# Altium footprint library con-amp.PCBLIB: 295 footprints (part 1 of 19)
Each footprint in its own frame and in the unit in brackets; x right, y up, seen from the top. Pads: shape width x height; smd on the part's side, far side on the other; paste and mask are expansions set on the pad; w line width, h text height; cw(c..) or ccw(c..) is an arc to the next point about the centre after c.
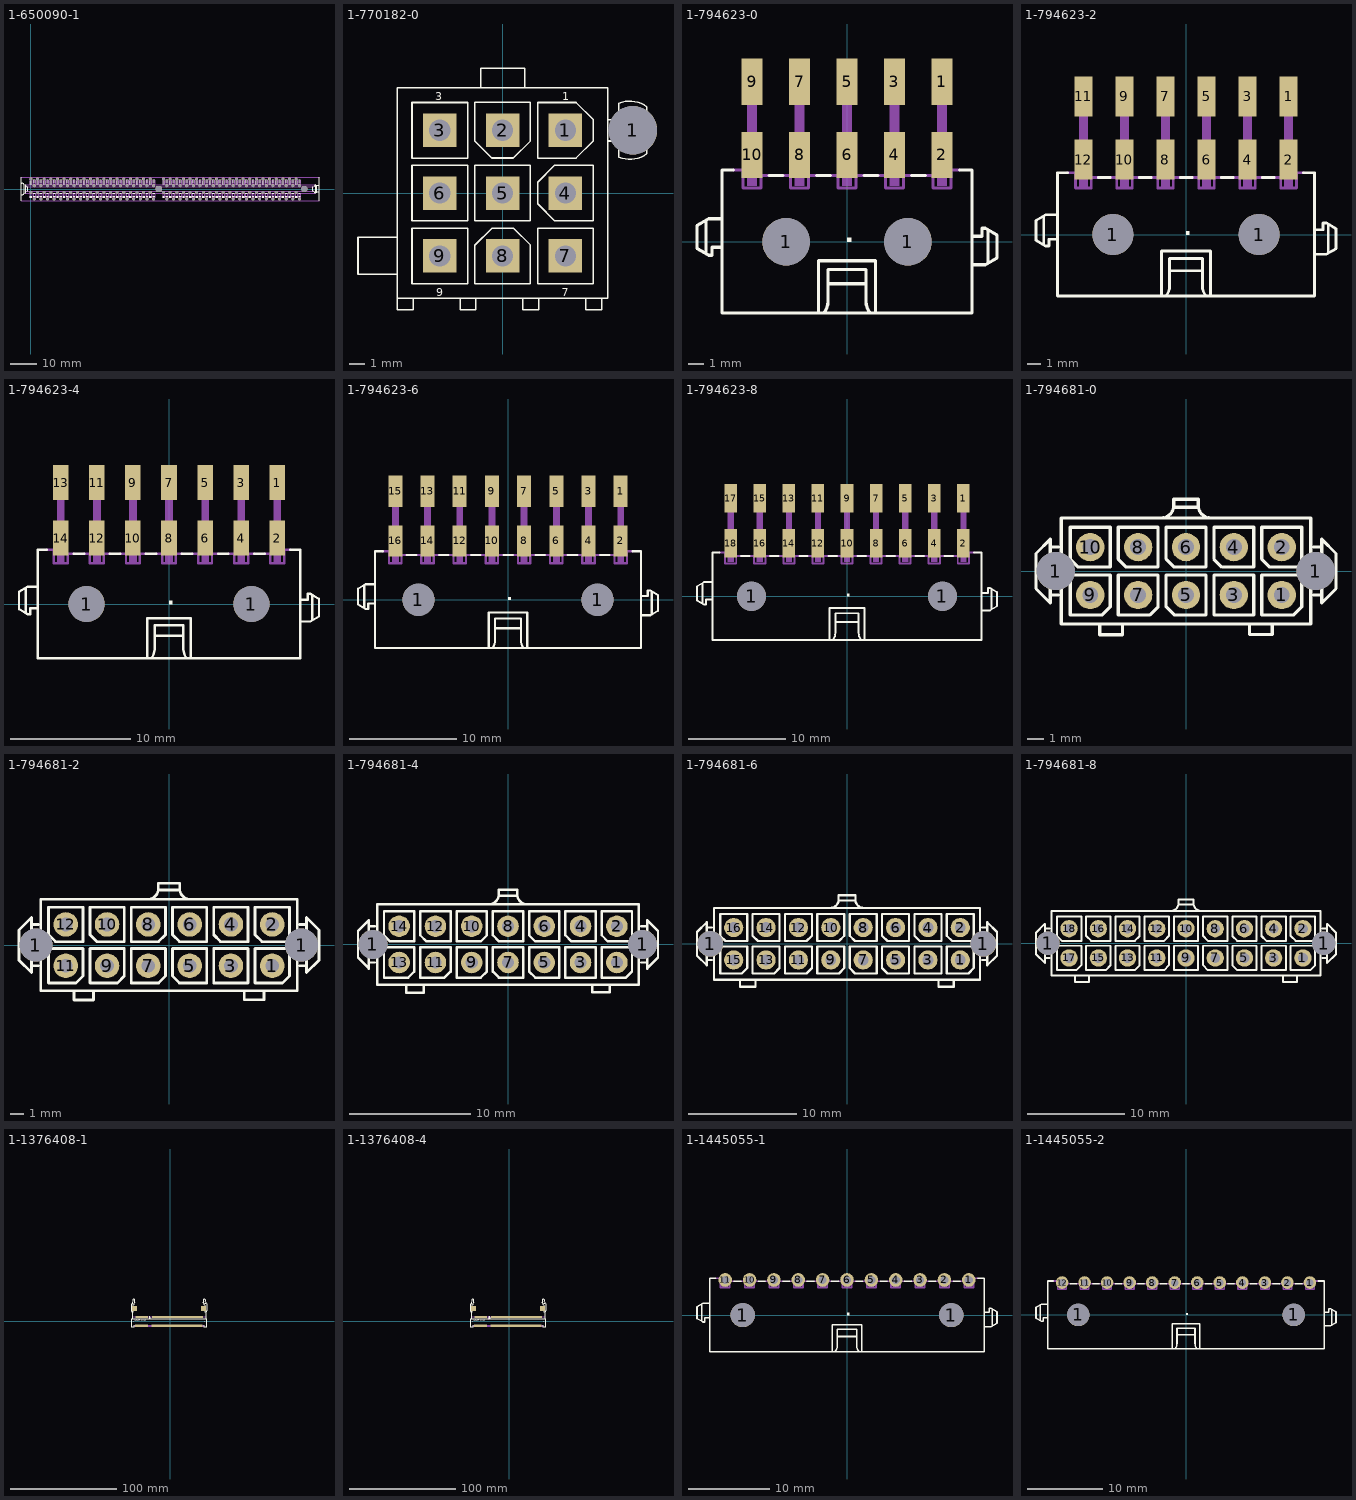
[diagram p0: the footprints below, top view; thin cyan lines are the x and y axes]

## 1-650090-1 [mm]
pads (162):
  round 1.2 hole 1: 1(0,-1.27) 2(0,3.81) 3(1.27,-3.81) 4(1.27,1.27) 5(2.54,-1.27) 6(2.54,3.81) 7(3.81,-3.81) 8(3.81,1.27) 9(5.08,-1.27) 10(5.08,3.81) 11(6.35,-3.81) 12(6.35,1.27) 13(7.62,-1.27) 14(7.62,3.81) 15(8.89,-3.81) 16(8.89,1.27) 17(10.16,-1.27) 18(10.16,3.81) 19(11.43,-3.81) 20(11.43,1.27) 21(12.7,-1.27) 22(12.7,3.81) 23(13.97,-3.81) 24(13.97,1.27) 25(15.24,-1.27) 26(15.24,3.81) 27(16.51,-3.81) 28(16.51,1.27) 29(17.78,-1.27) 30(17.78,3.81) 31(19.05,-3.81) 32(19.05,1.27) 33(20.32,-1.27) 34(20.32,3.81) 35(21.59,-3.81) 36(21.59,1.27) 37(22.86,-1.27) 38(22.86,3.81) 39(24.13,-3.81) 40(24.13,1.27) 41(25.4,-1.27) 42(25.4,3.81) 43(26.67,-3.81) 44(26.67,1.27) 45(27.94,-1.27) 46(27.94,3.81) 47(29.21,-3.81) 48(29.21,1.27) 49(30.48,-1.27) 50(30.48,3.81) 51(31.75,-3.81) 52(31.75,1.27) 53(33.02,-1.27) 54(33.02,3.81) 55(34.29,-3.81) 56(34.29,1.27) 57(35.56,-1.27) 58(35.56,3.81) 59(36.83,-3.81) 60(36.83,1.27) 61(38.1,-1.27) 62(38.1,3.81) 63(39.37,-3.81) 64(39.37,1.27) 65(40.64,-1.27) 66(40.64,3.81) 67(41.91,-3.81) 68(41.91,1.27) 69(43.18,-1.27) 70(43.18,3.81) 71(44.45,-3.81) 72(44.45,1.27) 73(45.72,-1.27) 74(45.72,3.81) 75(46.99,-3.81) 76(46.99,1.27) 77(50.8,-1.27) 78(50.8,3.81) 79(52.07,-3.81) 80(52.07,1.27) 81(53.34,-1.27) 82(53.34,3.81) 83(54.61,-3.81) 84(54.61,1.27) 85(55.88,-1.27) 86(55.88,3.81) 87(57.15,-3.81) 88(57.15,1.27) 89(58.42,-1.27) 90(58.42,3.81) 91(59.69,-3.81) 92(59.69,1.27) 93(60.96,-1.27) 94(60.96,3.81) 95(62.23,-3.81) 96(62.23,1.27) 97(63.5,-1.27) 98(63.5,3.81) 99(64.77,-3.81) 100(64.77,1.27) 101(66.04,-1.27) 102(66.04,3.81) 103(67.31,-3.81) 104(67.31,1.27) 105(68.58,-1.27) 106(68.58,3.81) 107(69.85,-3.81) 108(69.85,1.27) 109(71.12,-1.27) 110(71.12,3.81) 111(72.39,-3.81) 112(72.39,1.27) 113(73.66,-1.27) 114(73.66,3.81) 115(74.93,-3.81) 116(74.93,1.27) 117(76.2,-1.27) 118(76.2,3.81) 119(77.47,-3.81) 120(77.47,1.27) 121(78.74,-1.27) 122(78.74,3.81) 123(80.01,-3.81) 124(80.01,1.27) 125(81.28,-1.27) 126(81.28,3.81) 127(82.55,-3.81) 128(82.55,1.27) 129(83.82,-1.27) 130(83.82,3.81) 131(85.09,-3.81) 132(85.09,1.27) 133(86.36,-1.27) 134(86.36,3.81) 135(87.63,-3.81) 136(87.63,1.27) 137(88.9,-1.27) 138(88.9,3.81) 139(90.17,-3.81) 140(90.17,1.27) 141(91.44,-1.27) 142(91.44,3.81) 143(92.71,-3.81) 144(92.71,1.27) 145(93.98,-1.27) 146(93.98,3.81) 147(95.25,-3.81) 148(95.25,1.27) 149(96.52,-1.27) 150(96.52,3.81) 151(97.79,-3.81) 152(97.79,1.27) 153(99.06,-1.27) 154(99.06,3.81) 155(100.33,-3.81) 156(100.33,1.27) 157(101.6,-1.27) 158(101.6,3.81) 159(102.87,-3.81) 160(102.87,1.27)
  round 2.44 hole 2.44: 1(48.89,0) 1(104.77,0)
Top Overlay:
  drawing of 344 lines, arcs and shapes, not listed
Mechanical 16:
  drawing of 490 lines, arcs and shapes, not listed

## 1-770182-0 [mil]
pads (10):
  rect 86.61x86.61 hole 55.12: 1(162.99,162.99) 2(0,162.99) 3(-162.99,162.99) 4(162.99,0) 5(0,0) 6(-162.99,0) 7(162.99,-162.99) 8(0,-162.99) 9(-162.99,-162.99)
  round 125.98 hole 125.98: 1(338.19,162.99)
Top Overlay:
  lines w4: -272.83,-272.93 -231.99,-272.93 ; -272.83,-272.93 -272.83,-210.93 ; -272.83,-272.93 -272.83,-302.95 -231.99,-302.95 -231.99,-272.93 ; -272.83,-210.93 -272.83,-114.96 ; -272.83,-210.93 -375.2,-210.93 -375.2,-114.96 -272.83,-114.96 ; -272.83,-114.96 -272.83,272.93 -57.09,272.93 ; -231.99,-272.93 -110.04,-272.93 ; -110.04,-272.93 -69.19,-272.93 ; -110.04,-272.93 -110.04,-302.95 -69.19,-302.95 -69.19,-272.93 ; -69.19,-272.93 52.85,-272.93 ; -57.09,272.93 57.09,272.93 ; -57.09,272.93 -57.09,324.11 57.09,324.11 57.09,272.93 ; 52.85,-272.93 94.19,-272.93 ; 52.85,-272.93 52.85,-302.95 94.19,-302.95 94.19,-272.93 ; 57.09,272.93 272.83,272.93 272.83,190.75 ; 94.19,-272.93 216.24,-272.93 ; 216.24,-272.93 257.09,-272.93 ; 216.24,-272.93 216.24,-302.95 257.09,-302.95 257.09,-272.93 ; 257.09,-272.93 272.83,-272.93 272.83,135.14 ; 272.83,135.14 272.83,190.75 ; 272.83,135.14 301.87,135.14 301.87,135.63 ; 272.83,190.75 301.87,190.75 301.87,190.26 ; 301.87,135.63 301.87,190.26 ; 301.87,135.63 301.87,93.31 ccw(c330.51,160.14) 373.72,101.67 373.72,224.21 ccw(c330.01,165.51) 301.87,233.07 301.87,190.26 ; -235.04,-235.14 -90.85,-235.14 -90.85,-90.94 -235.04,-90.94 -235.04,-235.14 ; -235.04,-72.15 -90.85,-72.15 -90.85,72.05 -235.04,72.05 -235.04,-72.15 ; -235.04,90.85 -90.85,90.85 -90.85,235.04 -235.04,235.04 -235.04,90.85 ; -72.15,-235.24 72.05,-235.24 72.05,-134.84 28.25,-91.04 -27.85,-91.04 -72.15,-135.33 -72.15,-235.24 ; -72.05,-72.15 72.15,-72.15 72.15,72.05 -72.05,72.05 -72.05,-72.15 ; -72.05,134.84 -28.25,91.04 27.85,91.04 72.15,135.33 72.15,235.24 -72.05,235.24 -72.05,134.84 ; 90.75,90.85 190.65,90.85 234.94,135.14 234.94,190.75 190.65,235.04 90.75,235.04 90.75,90.85 ; 90.94,-235.14 235.14,-235.14 235.14,-90.94 90.94,-90.94 90.94,-235.14 ; 91.04,-27.85 135.33,-72.15 235.24,-72.15 235.24,72.05 134.84,72.05 91.04,28.25 91.04,-27.85
  text "9" at -172.24,-267.72 h21.25
  text "3" at -174.21,241.14 h21.25
  text "1" at 154.53,241.14 h21.25
  text "7" at 153.54,-267.72 h21.25

## 1-794623-0 [mm]
pads (12):
  round 3 hole 3: 1(-3.85,0) 1(3.85,0)
  rect 1.3x2.92 smd: 1(6,10.1) 2(6,5.48) 3(3,10.1) 4(3,5.48) 5(0,10.1) 6(0,5.48) 7(-3,10.1) 8(-3,5.48) 9(-6,10.1) 10(-6,5.48)
Top Overlay:
  region: 0,0 0.254,0 0.254,0.254 0,0.254
  region: 0,0 0.254,0 0.254,0.254 0,0.254
  region: 0,0 0.254,0 0.254,0.254 0,0.254
  region: 0,0 0.254,0 0.254,0.254 0,0.254
  lines w0.203: -8.9,-0.7 -8.9,1.3 ; -8,-0.35 -8.525,-0.35 -8.525,-0.85 -8.75,-0.85 -9.475,-0.425 -9.475,1.025 -8.75,1.45 -8,1.45 ; -7.175,4.525 -7.9,4.525 -7.9,-4.5 7.9,-4.5 7.9,4.525 7.1,4.525 ; -4.925,4.175 -4.05,4.175 ; -1.925,4.175 -1.05,4.175 ; -1.8,-4.4 -1.8,-1.2 1.8,-1.2 1.8,-4.4 ; -1.425,-4.45 ccw(c-2.325,-3.775) -1.2,-3.775 -1.2,-2.65 ; 1.075,4.175 1.95,4.175 ; 1.425,-4.45 cw(c2.325,-3.775) 1.2,-3.775 1.2,-2.65 ; 4.075,4.175 4.95,4.175 ; 8,-1.45 8.75,-1.45 9.475,-1.025 9.475,0.425 8.75,0.85 8.525,0.85 8.525,0.35 8,0.35 ; 8.9,-1.3 8.9,0.7 ; -1.2,-2.65 1.2,-2.65 ; -1.2,-2.65 -1.2,-1.75 1.2,-1.75 1.2,-2.65
Mechanical 16:
  rectangle: 5.688,3.513 6.325,11.025
  rectangle: 2.688,3.513 3.325,11.025
  rectangle: -0.312,3.513 0.325,11.025
  rectangle: -3.312,3.513 -2.675,11.025
  rectangle: -6.312,3.513 -5.675,11.025
  lines w0.203: -7.175,4.525 -6.575,4.525 -6.575,3.4 -5.425,3.4 -5.425,4.175 -4.925,4.175 ; -4.05,4.175 -3.575,4.175 -3.575,3.4 -2.425,3.4 -2.425,4.175 -1.925,4.175 ; -1.05,4.175 -0.575,4.175 -0.575,3.4 0.575,3.4 0.575,4.175 1.075,4.175 ; 1.95,4.175 2.425,4.175 2.425,3.4 3.575,3.4 3.575,4.175 4.075,4.175 ; 4.95,4.175 5.425,4.175 5.425,3.4 6.575,3.4 6.575,4.525 7.1,4.525

## 1-794623-2 [mm]
pads (14):
  round 3 hole 3: 1(-5.35,0) 1(5.35,0)
  rect 1.3x2.92 smd: 1(7.5,10.1) 2(7.5,5.48) 3(4.5,10.1) 4(4.5,5.48) 5(1.5,10.1) 6(1.5,5.48) 7(-1.5,10.1) 8(-1.5,5.48) 9(-4.5,10.1) 10(-4.5,5.48) 11(-7.5,10.1) 12(-7.5,5.48)
Top Overlay:
  region: 0,0 0.254,0 0.254,0.254 0,0.254
  region: 0,0 0.254,0 0.254,0.254 0,0.254
  region: 0,0 0.254,0 0.254,0.254 0,0.254
  region: 0,0 0.254,0 0.254,0.254 0,0.254
  lines w0.203: -10.4,-0.7 -10.4,1.3 ; -9.5,-0.35 -10.025,-0.35 -10.025,-0.85 -10.25,-0.85 -10.975,-0.425 -10.975,1.025 -10.25,1.45 -9.5,1.45 ; -8.675,4.525 -9.4,4.525 -9.4,-4.5 9.4,-4.5 9.4,4.525 8.6,4.525 ; -6.425,4.175 -5.55,4.175 ; -3.425,4.175 -2.55,4.175 ; -1.8,-4.4 -1.8,-1.2 1.8,-1.2 1.8,-4.4 ; -1.425,-4.45 ccw(c-2.325,-3.775) -1.2,-3.775 -1.2,-2.65 ; -0.425,4.175 0.45,4.175 ; 1.425,-4.45 cw(c2.325,-3.775) 1.2,-3.775 1.2,-2.65 ; 2.575,4.175 3.45,4.175 ; 5.575,4.175 6.45,4.175 ; 9.5,-1.45 10.25,-1.45 10.975,-1.025 10.975,0.425 10.25,0.85 10.025,0.85 10.025,0.35 9.5,0.35 ; 10.4,-1.3 10.4,0.7 ; -1.2,-2.65 1.2,-2.65 ; -1.2,-2.65 -1.2,-1.75 1.2,-1.75 1.2,-2.65
Mechanical 16:
  rectangle: 7.187,3.513 7.825,11.025
  rectangle: 4.187,3.513 4.825,11.025
  rectangle: 1.187,3.513 1.825,11.025
  rectangle: -1.813,3.513 -1.175,11.025
  rectangle: -4.813,3.513 -4.175,11.025
  rectangle: -7.813,3.513 -7.175,11.025
  lines w0.203: -8.675,4.525 -8.075,4.525 -8.075,3.4 -6.925,3.4 -6.925,4.175 -6.425,4.175 ; -5.55,4.175 -5.075,4.175 -5.075,3.4 -3.925,3.4 -3.925,4.175 -3.425,4.175 ; -2.55,4.175 -2.075,4.175 -2.075,3.4 -0.925,3.4 -0.925,4.175 -0.425,4.175 ; 0.45,4.175 0.925,4.175 0.925,3.4 2.075,3.4 2.075,4.175 2.575,4.175 ; 3.45,4.175 3.925,4.175 3.925,3.4 5.075,3.4 5.075,4.175 5.575,4.175 ; 6.45,4.175 6.925,4.175 6.925,3.4 8.075,3.4 8.075,4.525 8.6,4.525

## 1-794623-4 [mm]
pads (16):
  round 3 hole 3: 1(-6.85,0) 1(6.85,0)
  rect 1.3x2.92 smd: 1(9,10.1) 2(9,5.48) 3(6,10.1) 4(6,5.48) 5(3,10.1) 6(3,5.48) 7(0,10.1) 8(0,5.48) 9(-3,10.1) 10(-3,5.48) 11(-6,10.1) 12(-6,5.48) 13(-9,10.1) 14(-9,5.48)
Top Overlay:
  region: 0,0 0.254,0 0.254,0.254 0,0.254
  region: 0,0 0.254,0 0.254,0.254 0,0.254
  region: 0,0 0.254,0 0.254,0.254 0,0.254
  region: 0,0 0.254,0 0.254,0.254 0,0.254
  lines w0.203: -11.9,-0.7 -11.9,1.3 ; -11,-0.35 -11.525,-0.35 -11.525,-0.85 -11.75,-0.85 -12.475,-0.425 -12.475,1.025 -11.75,1.45 -11,1.45 ; -10.175,4.525 -10.9,4.525 -10.9,-4.5 10.9,-4.5 10.9,4.525 10.1,4.525 ; -7.925,4.175 -7.05,4.175 ; -4.925,4.175 -4.05,4.175 ; -1.925,4.175 -1.05,4.175 ; -1.8,-4.4 -1.8,-1.2 1.8,-1.2 1.8,-4.4 ; -1.425,-4.45 ccw(c-2.325,-3.775) -1.2,-3.775 -1.2,-2.65 ; 1.075,4.175 1.95,4.175 ; 1.425,-4.45 cw(c2.325,-3.775) 1.2,-3.775 1.2,-2.65 ; 4.075,4.175 4.95,4.175 ; 7.075,4.175 7.95,4.175 ; 11,-1.45 11.75,-1.45 12.475,-1.025 12.475,0.425 11.75,0.85 11.525,0.85 11.525,0.35 11,0.35 ; 11.9,-1.3 11.9,0.7 ; -1.2,-2.65 1.2,-2.65 ; -1.2,-2.65 -1.2,-1.75 1.2,-1.75 1.2,-2.65
Mechanical 16:
  rectangle: 8.688,3.513 9.325,11.025
  rectangle: 5.688,3.513 6.325,11.025
  rectangle: 2.688,3.513 3.325,11.025
  rectangle: -0.312,3.513 0.325,11.025
  rectangle: -3.312,3.513 -2.675,11.025
  rectangle: -6.312,3.513 -5.675,11.025
  rectangle: -9.312,3.513 -8.675,11.025
  lines w0.203: -10.175,4.525 -9.575,4.525 -9.575,3.4 -8.425,3.4 -8.425,4.175 -7.925,4.175 ; -7.05,4.175 -6.575,4.175 -6.575,3.4 -5.425,3.4 -5.425,4.175 -4.925,4.175 ; -4.05,4.175 -3.575,4.175 -3.575,3.4 -2.425,3.4 -2.425,4.175 -1.925,4.175 ; -1.05,4.175 -0.575,4.175 -0.575,3.4 0.575,3.4 0.575,4.175 1.075,4.175 ; 1.95,4.175 2.425,4.175 2.425,3.4 3.575,3.4 3.575,4.175 4.075,4.175 ; 4.95,4.175 5.425,4.175 5.425,3.4 6.575,3.4 6.575,4.175 7.075,4.175 ; 7.95,4.175 8.425,4.175 8.425,3.4 9.575,3.4 9.575,4.525 10.1,4.525

## 1-794623-6 [mm]
pads (18):
  round 3 hole 3: 1(-8.35,0) 1(8.35,0)
  rect 1.3x2.92 smd: 1(10.5,10.1) 2(10.5,5.48) 3(7.5,10.1) 4(7.5,5.48) 5(4.5,10.1) 6(4.5,5.48) 7(1.5,10.1) 8(1.5,5.48) 9(-1.5,10.1) 10(-1.5,5.48) 11(-4.5,10.1) 12(-4.5,5.48) 13(-7.5,10.1) 14(-7.5,5.48) 15(-10.5,10.1) 16(-10.5,5.48)
Top Overlay:
  region: 0,0 0.254,0 0.254,0.254 0,0.254
  region: 0,0 0.254,0 0.254,0.254 0,0.254
  region: 0,0 0.254,0 0.254,0.254 0,0.254
  region: 0,0 0.254,0 0.254,0.254 0,0.254
  lines w0.203: -13.4,-0.7 -13.4,1.3 ; -12.5,-0.35 -13.025,-0.35 -13.025,-0.85 -13.25,-0.85 -13.975,-0.425 -13.975,1.025 -13.25,1.45 -12.5,1.45 ; -11.675,4.525 -12.4,4.525 -12.4,-4.5 12.4,-4.5 12.4,4.525 11.6,4.525 ; -9.425,4.175 -8.55,4.175 ; -6.425,4.175 -5.55,4.175 ; -3.425,4.175 -2.55,4.175 ; -1.8,-4.4 -1.8,-1.2 1.8,-1.2 1.8,-4.4 ; -1.425,-4.45 ccw(c-2.325,-3.775) -1.2,-3.775 -1.2,-2.65 ; -0.425,4.175 0.45,4.175 ; 1.425,-4.45 cw(c2.325,-3.775) 1.2,-3.775 1.2,-2.65 ; 2.575,4.175 3.45,4.175 ; 5.575,4.175 6.45,4.175 ; 8.575,4.175 9.45,4.175 ; 12.5,-1.45 13.25,-1.45 13.975,-1.025 13.975,0.425 13.25,0.85 13.025,0.85 13.025,0.35 12.5,0.35 ; 13.4,-1.3 13.4,0.7 ; -1.2,-2.65 1.2,-2.65 ; -1.2,-2.65 -1.2,-1.75 1.2,-1.75 1.2,-2.65
Mechanical 16:
  rectangle: 10.187,3.513 10.825,11.025
  rectangle: 7.187,3.513 7.825,11.025
  rectangle: 4.187,3.513 4.825,11.025
  rectangle: 1.187,3.513 1.825,11.025
  rectangle: -1.813,3.513 -1.175,11.025
  rectangle: -4.813,3.513 -4.175,11.025
  rectangle: -7.813,3.513 -7.175,11.025
  rectangle: -10.813,3.513 -10.175,11.025
  lines w0.203: -11.675,4.525 -11.075,4.525 -11.075,3.4 -9.925,3.4 -9.925,4.175 -9.425,4.175 ; -8.55,4.175 -8.075,4.175 -8.075,3.4 -6.925,3.4 -6.925,4.175 -6.425,4.175 ; -5.55,4.175 -5.075,4.175 -5.075,3.4 -3.925,3.4 -3.925,4.175 -3.425,4.175 ; -2.55,4.175 -2.075,4.175 -2.075,3.4 -0.925,3.4 -0.925,4.175 -0.425,4.175 ; 0.45,4.175 0.925,4.175 0.925,3.4 2.075,3.4 2.075,4.175 2.575,4.175 ; 3.45,4.175 3.925,4.175 3.925,3.4 5.075,3.4 5.075,4.175 5.575,4.175 ; 6.45,4.175 6.925,4.175 6.925,3.4 8.075,3.4 8.075,4.175 8.575,4.175 ; 9.45,4.175 9.925,4.175 9.925,3.4 11.075,3.4 11.075,4.525 11.6,4.525

## 1-794623-8 [mm]
pads (20):
  round 3 hole 3: 1(-9.85,0) 1(9.85,0)
  rect 1.3x2.92 smd: 1(12,10.1) 2(12,5.48) 3(9,10.1) 4(9,5.48) 5(6,10.1) 6(6,5.48) 7(3,10.1) 8(3,5.48) 9(0,10.1) 10(0,5.48) 11(-3,10.1) 12(-3,5.48) 13(-6,10.1) 14(-6,5.48) 15(-9,10.1) 16(-9,5.48) 17(-12,10.1) 18(-12,5.48)
Top Overlay:
  region: 0,0 0.254,0 0.254,0.254 0,0.254
  region: 0,0 0.254,0 0.254,0.254 0,0.254
  region: 0,0 0.254,0 0.254,0.254 0,0.254
  region: 0,0 0.254,0 0.254,0.254 0,0.254
  lines w0.203: -14.9,-0.7 -14.9,1.3 ; -14,-0.35 -14.525,-0.35 -14.525,-0.85 -14.75,-0.85 -15.475,-0.425 -15.475,1.025 -14.75,1.45 -14,1.45 ; -13.175,4.525 -13.9,4.525 -13.9,-4.5 13.9,-4.5 13.9,4.525 13.1,4.525 ; -10.925,4.175 -10.05,4.175 ; -7.925,4.175 -7.05,4.175 ; -4.925,4.175 -4.05,4.175 ; -1.925,4.175 -1.05,4.175 ; -1.8,-4.4 -1.8,-1.2 1.8,-1.2 1.8,-4.4 ; -1.425,-4.45 ccw(c-2.325,-3.775) -1.2,-3.775 -1.2,-2.65 ; 1.075,4.175 1.95,4.175 ; 1.425,-4.45 cw(c2.325,-3.775) 1.2,-3.775 1.2,-2.65 ; 4.075,4.175 4.95,4.175 ; 7.075,4.175 7.95,4.175 ; 10.075,4.175 10.95,4.175 ; 14,-1.45 14.75,-1.45 15.475,-1.025 15.475,0.425 14.75,0.85 14.525,0.85 14.525,0.35 14,0.35 ; 14.9,-1.3 14.9,0.7 ; -1.2,-2.65 1.2,-2.65 ; -1.2,-2.65 -1.2,-1.75 1.2,-1.75 1.2,-2.65
Mechanical 16:
  rectangle: 11.688,3.513 12.325,11.025
  rectangle: 8.688,3.513 9.325,11.025
  rectangle: 5.688,3.513 6.325,11.025
  rectangle: 2.688,3.513 3.325,11.025
  rectangle: -0.312,3.513 0.325,11.025
  rectangle: -3.312,3.513 -2.675,11.025
  rectangle: -6.312,3.513 -5.675,11.025
  rectangle: -9.312,3.513 -8.675,11.025
  rectangle: -12.312,3.513 -11.675,11.025
  lines w0.203: -13.175,4.525 -12.575,4.525 -12.575,3.4 -11.425,3.4 -11.425,4.175 -10.925,4.175 ; -10.05,4.175 -9.575,4.175 -9.575,3.4 -8.425,3.4 -8.425,4.175 -7.925,4.175 ; -7.05,4.175 -6.575,4.175 -6.575,3.4 -5.425,3.4 -5.425,4.175 -4.925,4.175 ; -4.05,4.175 -3.575,4.175 -3.575,3.4 -2.425,3.4 -2.425,4.175 -1.925,4.175 ; -1.05,4.175 -0.575,4.175 -0.575,3.4 0.575,3.4 0.575,4.175 1.075,4.175 ; 1.95,4.175 2.425,4.175 2.425,3.4 3.575,3.4 3.575,4.175 4.075,4.175 ; 4.95,4.175 5.425,4.175 5.425,3.4 6.575,3.4 6.575,4.175 7.075,4.175 ; 7.95,4.175 8.425,4.175 8.425,3.4 9.575,3.4 9.575,4.175 10.075,4.175 ; 10.95,4.175 11.425,4.175 11.425,3.4 12.575,3.4 12.575,4.525 13.1,4.525

## 1-794681-0 [mil]
pads (12):
  round 94.49 hole 94.49: 1(-321.65,0) 1(320.08,0)
  round 70 hole 39.37: 1(236.22,-59.06) 2(236.22,59.06) 3(118.11,-59.06) 4(118.11,59.06) 5(0,-59.06) 6(0,59.06) 7(-118.11,-59.06) 8(-118.11,59.06) 9(-236.22,-59.06) 10(-236.22,59.06)
Top Overlay:
  lines w8: -314.96,-59.06 -334.65,-59.06 ; -314.96,59.06 -334.65,59.06 ; -212.8,-135.43 -212.8,-157.09 -156.69,-157.09 -156.69,-135.43 ; -61.02,130.91 ccw(c-61.02,161.42) -30.51,161.42 -30.51,177.17 30.51,177.17 30.51,161.42 ccw(c61.02,161.42) 61.02,130.91 ; -29.53,157.48 29.53,157.48 ; 156.5,-134.84 156.5,-156.5 212.6,-156.5 212.6,-134.84 ; 314.96,-59.06 334.65,-59.06 ; 314.96,59.06 334.65,59.06 ; -334.65,-59.06 -334.65,59.06 ; -334.65,-59.06 -334.65,-78.74 -370.08,-43.31 -370.08,43.31 -334.65,78.74 -334.65,59.06 ; 334.65,-59.06 334.65,59.06 ; 334.65,-59.06 334.65,-78.74 370.08,-43.31 370.08,43.31 334.65,78.74 334.65,59.06 ; -308.07,-130.91 308.07,-130.91 308.07,130.91 -308.07,130.91 -308.07,-130.91 ; -285.43,-108.27 -285.43,-9.84 -187.01,-9.84 -187.01,-88.58 -206.69,-108.27 -285.43,-108.27 ; -285.43,29.53 -285.43,108.27 -187.01,108.27 -187.01,9.84 -265.75,9.84 -285.43,29.53 ; -167.32,-108.27 -88.58,-108.27 -68.9,-88.58 -68.9,-9.84 -167.32,-9.84 -167.32,-108.27 ; -167.32,29.53 -167.32,108.27 -68.9,108.27 -68.9,9.84 -147.64,9.84 -167.32,29.53 ; -49.21,-88.58 -49.21,-9.84 49.21,-9.84 49.21,-108.27 -29.53,-108.27 -49.21,-88.58 ; -49.21,29.53 -49.21,108.27 49.21,108.27 49.21,9.84 -29.53,9.84 -49.21,29.53 ; 68.9,-108.27 68.9,-9.84 167.32,-9.84 167.32,-108.27 68.9,-108.27 ; 68.9,29.53 68.9,108.27 167.32,108.27 167.32,9.84 88.58,9.84 68.9,29.53 ; 187.01,-108.27 187.01,-9.84 285.43,-9.84 285.43,-88.58 265.75,-108.27 187.01,-108.27 ; 187.01,29.53 187.01,108.27 285.43,108.27 285.43,9.84 206.69,9.84 187.01,29.53

## 1-794681-2 [mil]
pads (14):
  round 94.49 hole 94.49: 1(-380.71,0) 1(379.13,0)
  round 70 hole 39.37: 1(295.28,-59.06) 2(295.28,59.06) 3(177.17,-59.06) 4(177.17,59.06) 5(59.06,-59.06) 6(59.06,59.06) 7(-59.06,-59.06) 8(-59.06,59.06) 9(-177.17,-59.06) 10(-177.17,59.06) 11(-295.28,-59.06) 12(-295.28,59.06)
Top Overlay:
  lines w8: -374.02,-59.06 -393.7,-59.06 ; -374.02,59.06 -393.7,59.06 ; -271.85,-135.43 -271.85,-157.09 -215.75,-157.09 -215.75,-135.43 ; -61.02,130.91 ccw(c-61.02,161.42) -30.51,161.42 -30.51,177.17 30.51,177.17 30.51,161.42 ccw(c61.02,161.42) 61.02,130.91 ; -29.53,157.48 29.53,157.48 ; 215.55,-134.84 215.55,-156.5 271.65,-156.5 271.65,-134.84 ; 374.02,-59.06 393.7,-59.06 ; 374.02,59.06 393.7,59.06 ; -393.7,-59.06 -393.7,59.06 ; -393.7,-59.06 -393.7,-78.74 -429.13,-43.31 -429.13,43.31 -393.7,78.74 -393.7,59.06 ; 393.7,-59.06 393.7,59.06 ; 393.7,-59.06 393.7,-78.74 429.13,-43.31 429.13,43.31 393.7,78.74 393.7,59.06 ; -367.13,-130.91 367.13,-130.91 367.13,130.91 -367.13,130.91 -367.13,-130.91 ; -344.49,-108.27 -344.49,-9.84 -246.06,-9.84 -246.06,-88.58 -265.75,-108.27 -344.49,-108.27 ; -344.49,29.53 -344.49,108.27 -246.06,108.27 -246.06,9.84 -324.8,9.84 -344.49,29.53 ; -226.38,-108.27 -147.64,-108.27 -127.95,-88.58 -127.95,-9.84 -226.38,-9.84 -226.38,-108.27 ; -226.38,29.53 -226.38,108.27 -127.95,108.27 -127.95,9.84 -206.69,9.84 -226.38,29.53 ; -108.27,-108.27 -108.27,-9.84 -9.84,-9.84 -9.84,-88.58 -29.53,-108.27 -108.27,-108.27 ; -108.27,9.84 -29.53,9.84 -9.84,29.53 -9.84,108.27 -108.27,108.27 -108.27,9.84 ; 9.84,-88.58 9.84,-9.84 108.27,-9.84 108.27,-108.27 29.53,-108.27 9.84,-88.58 ; 9.84,29.53 9.84,108.27 108.27,108.27 108.27,9.84 29.53,9.84 9.84,29.53 ; 127.95,-108.27 127.95,-9.84 226.38,-9.84 226.38,-108.27 127.95,-108.27 ; 127.95,29.53 127.95,108.27 226.38,108.27 226.38,9.84 147.64,9.84 127.95,29.53 ; 246.06,-108.27 246.06,-9.84 344.49,-9.84 344.49,-88.58 324.8,-108.27 246.06,-108.27 ; 246.06,29.53 246.06,108.27 344.49,108.27 344.49,9.84 265.75,9.84 246.06,29.53

## 1-794681-4 [mil]
pads (16):
  round 94.49 hole 94.49: 1(-439.76,0) 1(438.19,0)
  round 70 hole 39.37: 1(354.33,-59.06) 2(354.33,59.06) 3(236.22,-59.06) 4(236.22,59.06) 5(118.11,-59.06) 6(118.11,59.06) 7(0,-59.06) 8(0,59.06) 9(-118.11,-59.06) 10(-118.11,59.06) 11(-236.22,-59.06) 12(-236.22,59.06) 13(-354.33,-59.06) 14(-354.33,59.06)
Top Overlay:
  lines w8: -433.07,-59.06 -452.76,-59.06 ; -433.07,59.06 -452.76,59.06 ; -330.91,-135.43 -330.91,-157.09 -274.8,-157.09 -274.8,-135.43 ; -61.02,130.91 ccw(c-61.02,161.42) -30.51,161.42 -30.51,177.17 30.51,177.17 30.51,161.42 ccw(c61.02,161.42) 61.02,130.91 ; -29.53,157.48 29.53,157.48 ; 274.61,-134.84 274.61,-156.5 330.71,-156.5 330.71,-134.84 ; 433.07,-59.06 452.76,-59.06 ; 433.07,59.06 452.76,59.06 ; -452.76,-59.06 -452.76,59.06 ; -452.76,-59.06 -452.76,-78.74 -488.19,-43.31 -488.19,43.31 -452.76,78.74 -452.76,59.06 ; 452.76,-59.06 452.76,59.06 ; 452.76,-59.06 452.76,-78.74 488.19,-43.31 488.19,43.31 452.76,78.74 452.76,59.06 ; -426.18,-130.91 426.18,-130.91 426.18,130.91 -426.18,130.91 -426.18,-130.91 ; -403.54,-108.27 -403.54,-9.84 -305.12,-9.84 -305.12,-88.58 -324.8,-108.27 -403.54,-108.27 ; -403.54,29.53 -403.54,108.27 -305.12,108.27 -305.12,9.84 -383.86,9.84 -403.54,29.53 ; -285.43,-108.27 -206.69,-108.27 -187.01,-88.58 -187.01,-9.84 -285.43,-9.84 -285.43,-108.27 ; -285.43,29.53 -285.43,108.27 -187.01,108.27 -187.01,9.84 -265.75,9.84 -285.43,29.53 ; -167.32,-108.27 -167.32,-9.84 -68.9,-9.84 -68.9,-88.58 -88.58,-108.27 -167.32,-108.27 ; -167.32,9.84 -88.58,9.84 -68.9,29.53 -68.9,108.27 -167.32,108.27 -167.32,9.84 ; -49.21,-88.58 -49.21,-9.84 49.21,-9.84 49.21,-108.27 -29.53,-108.27 -49.21,-88.58 ; -49.21,29.53 -49.21,108.27 49.21,108.27 49.21,9.84 -29.53,9.84 -49.21,29.53 ; 68.9,-88.58 68.9,-9.84 167.32,-9.84 167.32,-108.27 88.58,-108.27 68.9,-88.58 ; 68.9,29.53 68.9,108.27 167.32,108.27 167.32,9.84 88.58,9.84 68.9,29.53 ; 187.01,-108.27 187.01,-9.84 285.43,-9.84 285.43,-108.27 187.01,-108.27 ; 187.01,29.53 187.01,108.27 285.43,108.27 285.43,9.84 206.69,9.84 187.01,29.53 ; 305.12,-108.27 305.12,-9.84 403.54,-9.84 403.54,-88.58 383.86,-108.27 305.12,-108.27 ; 305.12,29.53 305.12,108.27 403.54,108.27 403.54,9.84 324.8,9.84 305.12,29.53

## 1-794681-6 [mil]
pads (18):
  round 94.49 hole 94.49: 1(-498.82,0) 1(497.24,0)
  round 70 hole 39.37: 1(413.39,-59.06) 2(413.39,59.06) 3(295.28,-59.06) 4(295.28,59.06) 5(177.17,-59.06) 6(177.17,59.06) 7(59.06,-59.06) 8(59.06,59.06) 9(-59.06,-59.06) 10(-59.06,59.06) 11(-177.17,-59.06) 12(-177.17,59.06) 13(-295.28,-59.06) 14(-295.28,59.06) 15(-413.39,-59.06) 16(-413.39,59.06)
Top Overlay:
  lines w8: -492.13,-59.06 -511.81,-59.06 ; -492.13,59.06 -511.81,59.06 ; -389.96,-135.43 -389.96,-157.09 -333.86,-157.09 -333.86,-135.43 ; -61.02,130.91 ccw(c-61.02,161.42) -30.51,161.42 -30.51,177.17 30.51,177.17 30.51,161.42 ccw(c61.02,161.42) 61.02,130.91 ; -29.53,157.48 29.53,157.48 ; 333.66,-134.84 333.66,-156.5 389.76,-156.5 389.76,-134.84 ; 492.13,-59.06 511.81,-59.06 ; 492.13,59.06 511.81,59.06 ; -511.81,-59.06 -511.81,59.06 ; -511.81,-59.06 -511.81,-78.74 -547.24,-43.31 -547.24,43.31 -511.81,78.74 -511.81,59.06 ; 511.81,-59.06 511.81,59.06 ; 511.81,-59.06 511.81,-78.74 547.24,-43.31 547.24,43.31 511.81,78.74 511.81,59.06 ; -485.24,-130.91 485.24,-130.91 485.24,130.91 -485.24,130.91 -485.24,-130.91 ; -462.6,-108.27 -462.6,-9.84 -364.17,-9.84 -364.17,-88.58 -383.86,-108.27 -462.6,-108.27 ; -462.6,29.53 -462.6,108.27 -364.17,108.27 -364.17,9.84 -442.91,9.84 -462.6,29.53 ; -344.49,-108.27 -265.75,-108.27 -246.06,-88.58 -246.06,-9.84 -344.49,-9.84 -344.49,-108.27 ; -344.49,29.53 -344.49,108.27 -246.06,108.27 -246.06,9.84 -324.8,9.84 -344.49,29.53 ; -226.38,-108.27 -226.38,-9.84 -127.95,-9.84 -127.95,-88.58 -147.64,-108.27 -226.38,-108.27 ; -226.38,9.84 -147.64,9.84 -127.95,29.53 -127.95,108.27 -226.38,108.27 -226.38,9.84 ; -108.27,-108.27 -29.53,-108.27 -9.84,-88.58 -9.84,-9.84 -108.27,-9.84 -108.27,-108.27 ; -108.27,9.84 -29.53,9.84 -9.84,29.53 -9.84,108.27 -108.27,108.27 -108.27,9.84 ; 9.84,-88.58 9.84,-9.84 108.27,-9.84 108.27,-108.27 29.53,-108.27 9.84,-88.58 ; 9.84,29.53 9.84,108.27 108.27,108.27 108.27,9.84 29.53,9.84 9.84,29.53 ; 127.95,-88.58 127.95,-9.84 226.38,-9.84 226.38,-108.27 147.64,-108.27 127.95,-88.58 ; 127.95,29.53 127.95,108.27 226.38,108.27 226.38,9.84 147.64,9.84 127.95,29.53 ; 246.06,-108.27 246.06,-9.84 344.49,-9.84 344.49,-108.27 246.06,-108.27 ; 246.06,29.53 246.06,108.27 344.49,108.27 344.49,9.84 265.75,9.84 246.06,29.53 ; 364.17,-108.27 364.17,-9.84 462.6,-9.84 462.6,-88.58 442.91,-108.27 364.17,-108.27 ; 364.17,29.53 364.17,108.27 462.6,108.27 462.6,9.84 383.86,9.84 364.17,29.53

## 1-794681-8 [mil]
pads (20):
  round 94.49 hole 94.49: 1(-557.87,0) 1(556.3,0)
  round 70 hole 39.37: 1(472.44,-59.06) 2(472.44,59.06) 3(354.33,-59.06) 4(354.33,59.06) 5(236.22,-59.06) 6(236.22,59.06) 7(118.11,-59.06) 8(118.11,59.06) 9(0,-59.06) 10(0,59.06) 11(-118.11,-59.06) 12(-118.11,59.06) 13(-236.22,-59.06) 14(-236.22,59.06) 15(-354.33,-59.06) 16(-354.33,59.06) 17(-472.44,-59.06) 18(-472.44,59.06)
Top Overlay:
  lines w8: -551.18,-59.06 -570.87,-59.06 ; -551.18,59.06 -570.87,59.06 ; -449.02,-135.43 -449.02,-157.09 -392.91,-157.09 -392.91,-135.43 ; -61.02,130.91 ccw(c-61.02,161.42) -30.51,161.42 -30.51,177.17 30.51,177.17 30.51,161.42 ccw(c61.02,161.42) 61.02,130.91 ; -29.53,157.48 29.53,157.48 ; 392.72,-134.84 392.72,-156.5 448.82,-156.5 448.82,-134.84 ; 551.18,-59.06 570.87,-59.06 ; 551.18,59.06 570.87,59.06 ; -570.87,-59.06 -570.87,59.06 ; -570.87,-59.06 -570.87,-78.74 -606.3,-43.31 -606.3,43.31 -570.87,78.74 -570.87,59.06 ; 570.87,-59.06 570.87,59.06 ; 570.87,-59.06 570.87,-78.74 606.3,-43.31 606.3,43.31 570.87,78.74 570.87,59.06 ; -544.29,-130.91 544.29,-130.91 544.29,130.91 -544.29,130.91 -544.29,-130.91 ; -521.65,-108.27 -521.65,-9.84 -423.23,-9.84 -423.23,-88.58 -442.91,-108.27 -521.65,-108.27 ; -521.65,29.53 -521.65,108.27 -423.23,108.27 -423.23,9.84 -501.97,9.84 -521.65,29.53 ; -403.54,-108.27 -324.8,-108.27 -305.12,-88.58 -305.12,-9.84 -403.54,-9.84 -403.54,-108.27 ; -403.54,29.53 -403.54,108.27 -305.12,108.27 -305.12,9.84 -383.86,9.84 -403.54,29.53 ; -285.43,-108.27 -285.43,-9.84 -187.01,-9.84 -187.01,-88.58 -206.69,-108.27 -285.43,-108.27 ; -285.43,9.84 -206.69,9.84 -187.01,29.53 -187.01,108.27 -285.43,108.27 -285.43,9.84 ; -167.32,-108.27 -88.58,-108.27 -68.9,-88.58 -68.9,-9.84 -167.32,-9.84 -167.32,-108.27 ; -167.32,9.84 -88.58,9.84 -68.9,29.53 -68.9,108.27 -167.32,108.27 -167.32,9.84 ; -49.21,-108.27 49.21,-108.27 49.21,-9.84 -49.21,-9.84 -49.21,-108.27 ; -49.21,9.84 49.21,9.84 49.21,108.27 -49.21,108.27 -49.21,9.84 ; 68.9,-88.58 68.9,-9.84 167.32,-9.84 167.32,-108.27 88.58,-108.27 68.9,-88.58 ; 68.9,29.53 68.9,108.27 167.32,108.27 167.32,9.84 88.58,9.84 68.9,29.53 ; 187.01,-88.58 187.01,-9.84 285.43,-9.84 285.43,-108.27 206.69,-108.27 187.01,-88.58 ; 187.01,29.53 187.01,108.27 285.43,108.27 285.43,9.84 206.69,9.84 187.01,29.53 ; 305.12,-108.27 305.12,-9.84 403.54,-9.84 403.54,-108.27 305.12,-108.27 ; 305.12,29.53 305.12,108.27 403.54,108.27 403.54,9.84 324.8,9.84 305.12,29.53 ; 423.23,-108.27 423.23,-9.84 521.65,-9.84 521.65,-88.58 501.97,-108.27 423.23,-108.27 ; 423.23,29.53 423.23,108.27 521.65,108.27 521.65,9.84 442.91,9.84 423.23,29.53

## 1-1376408-1 [mm]
pads (204):
  round 0.6 hole 0.6: 1(-34.4,0)
  rect 0.35x2 smd: 1(-32.65,-4.1) 2(-32.35,4.1) 3(-32.05,-4.1) 4(-31.75,4.1) 5(-31.45,-4.1) 6(-31.15,4.1) 7(-30.85,-4.1) 8(-30.55,4.1) 9(-30.25,-4.1) 10(-29.95,4.1) 11(-29.65,-4.1) 12(-29.35,4.1) 13(-29.05,-4.1) 14(-28.75,4.1) 15(-28.45,-4.1) 16(-28.15,4.1) 17(-27.85,-4.1) 18(-27.55,4.1) 19(-27.25,-4.1) 20(-26.95,4.1) 21(-26.65,-4.1) 22(-26.35,4.1) 23(-26.05,-4.1) 24(-25.75,4.1) 25(-25.45,-4.1) 26(-25.15,4.1) 27(-24.85,-4.1) 28(-24.55,4.1) 29(-24.25,-4.1) 30(-23.95,4.1) 31(-23.65,-4.1) 32(-23.35,4.1) 33(-23.05,-4.1) 34(-22.75,4.1) 35(-22.45,-4.1) 36(-22.15,4.1) 37(-21.85,-4.1) 38(-21.55,4.1) 39(-21.25,-4.1) 40(-20.95,4.1) 41(-17.05,-4.1) 42(-16.75,4.1) 43(-16.45,-4.1) 44(-16.15,4.1) 45(-15.85,-4.1) 46(-15.55,4.1) 47(-15.25,-4.1) 48(-14.95,4.1) 49(-14.65,-4.1) 50(-14.35,4.1) 51(-14.05,-4.1) 52(-13.75,4.1) 53(-13.45,-4.1) 54(-13.15,4.1) 55(-12.85,-4.1) 56(-12.55,4.1) 57(-12.25,-4.1) 58(-11.95,4.1) 59(-11.65,-4.1) 60(-11.35,4.1) 61(-11.05,-4.1) 62(-10.75,4.1) 63(-10.45,-4.1) 64(-10.15,4.1) 65(-9.85,-4.1) 66(-9.55,4.1) 67(-9.25,-4.1) 68(-8.95,4.1) 69(-8.65,-4.1) 70(-8.35,4.1) 71(-8.05,-4.1) 72(-7.75,4.1) 73(-7.45,-4.1) 74(-7.15,4.1) 75(-6.85,-4.1) 76(-6.55,4.1) 77(-6.25,-4.1) 78(-5.95,4.1) 79(-5.65,-4.1) 80(-5.35,4.1) 81(-5.05,-4.1) 82(-4.75,4.1) 83(-4.45,-4.1) 84(-4.15,4.1) 85(-3.85,-4.1) 86(-3.55,4.1) 87(-3.25,-4.1) 88(-2.95,4.1) 89(-2.65,-4.1) 90(-2.35,4.1) 91(-2.05,-4.1) 92(-1.75,4.1) 93(-1.45,-4.1) 94(-1.15,4.1) 95(-0.85,-4.1) 96(-0.55,4.1) 97(-0.25,-4.1) 98(0.05,4.1) 99(0.35,-4.1) 100(0.65,4.1) 101(0.95,-4.1) 102(1.25,4.1) 103(1.55,-4.1) 104(1.85,4.1) 105(2.15,-4.1) 106(2.45,4.1) 107(2.75,-4.1) 108(3.05,4.1) 109(3.35,-4.1) 110(3.65,4.1) 111(3.95,-4.1) 112(4.25,4.1) 113(4.55,-4.1) 114(4.85,4.1) 115(5.15,-4.1) 116(5.45,4.1) 117(5.75,-4.1) 118(6.05,4.1) 119(6.35,-4.1) 120(6.65,4.1) 121(6.95,-4.1) 122(7.25,4.1) 123(7.55,-4.1) 124(7.85,4.1) 125(8.15,-4.1) 126(8.45,4.1) 127(8.75,-4.1) 128(9.05,4.1) 129(9.35,-4.1) 130(9.65,4.1) 131(9.95,-4.1) 132(10.25,4.1) 133(10.55,-4.1) 134(10.85,4.1) 135(11.15,-4.1) 136(11.45,4.1) 137(11.75,-4.1) 138(12.05,4.1) 139(12.35,-4.1) 140(12.65,4.1) 141(12.95,-4.1) 142(13.25,4.1) 143(13.55,-4.1) 144(13.85,4.1) 145(14.15,-4.1) 146(14.45,4.1) 147(14.75,-4.1) 148(15.05,4.1) 149(15.35,-4.1) 150(15.65,4.1) 151(15.95,-4.1) 152(16.25,4.1) 153(16.55,-4.1) 154(16.85,4.1) 155(17.15,-4.1) 156(17.45,4.1) 157(17.75,-4.1) 158(18.05,4.1) 159(18.35,-4.1) 160(18.65,4.1) 161(18.95,-4.1) 162(19.25,4.1) 163(19.55,-4.1) 164(19.85,4.1) 165(20.15,-4.1) 166(20.45,4.1) 167(20.75,-4.1) 168(21.05,4.1) 169(21.35,-4.1) 170(21.65,4.1) 171(21.95,-4.1) 172(22.25,4.1) 173(22.55,-4.1) 174(22.85,4.1) 175(23.15,-4.1) 176(23.45,4.1) 177(23.75,-4.1) 178(24.05,4.1) 179(24.35,-4.1) 180(24.65,4.1) 181(24.95,-4.1) 182(25.25,4.1) 183(25.55,-4.1) 184(25.85,4.1) 185(26.15,-4.1) 186(26.45,4.1) 187(26.75,-4.1) 188(27.05,4.1) 189(27.35,-4.1) 190(27.65,4.1) 191(27.95,-4.1) 192(28.25,4.1) 193(28.55,-4.1) 194(28.85,4.1) 195(29.15,-4.1) 196(29.45,4.1) 197(29.75,-4.1) 198(30.05,4.1) 199(30.35,-4.1) 200(30.65,4.1)
  round 1.1 hole 1.1: 1(32.4,0)
  rect 4.5x4.6 smd: M1(-33.55,12) M2(31.55,12)
Top Overlay:
  region: 0,0 0.254,0 0.254,0.254 0,0.254
  lines w0.203: -36.65,16.35 -36.65,9.9 -35.5,8.55 -35.5,1.85 ; -35.25,8.45 cw(c52.49,6.921) -34.75,16.4 ; -33.65,-3.8 -33.65,-4.9 -36.45,-4.9 -36.45,1.75 34.45,1.75 34.45,-4.9 31.65,-4.9 31.65,-3.8 ; -19.8,1.85 -19.8,3.85 cw(c-19.45,3.825) -19.1,3.85 -19.1,1.85 ; 33.25,8.45 ccw(c-54.49,6.921) 32.75,16.4 ; 33.5,1.85 33.5,8.55 34.65,9.9 34.65,16.35 ; -34.75,16.4 -33.85,16.25 -33.25,17.85 -33.85,18.05 cw(c-33.795,18.198) -33.75,18.35 -33.15,18.15 ccw(c-38.2,18.8) -33.35,20.35 ccw(c-34.199,19.968) -35.1,20.2 -35.45,16.55 -34.75,16.4 ; 32.75,16.4 31.85,16.25 31.25,17.85 31.85,18.05 ccw(c31.795,18.198) 31.75,18.35 31.15,18.15 cw(c36.2,18.8) 31.35,20.35 cw(c32.199,19.968) 33.1,20.2 33.45,16.55 32.75,16.4
  text "DDR STD" at -33.25,-0.75 h2.76
Mechanical 16:
  lines w0.203: -35.4,4.4 33.4,4.4 ; -33.65,-3.8 31.65,-3.8 ; -33.55,-4.4 31.55,-4.4

## 1-1376408-4 [mm]
pads (204):
  round 0.6 hole 0.6: 1(-34.4,0)
  rect 0.35x2 smd: 1(-32.65,-4.1) 2(-32.35,4.1) 3(-32.05,-4.1) 4(-31.75,4.1) 5(-31.45,-4.1) 6(-31.15,4.1) 7(-30.85,-4.1) 8(-30.55,4.1) 9(-30.25,-4.1) 10(-29.95,4.1) 11(-29.65,-4.1) 12(-29.35,4.1) 13(-29.05,-4.1) 14(-28.75,4.1) 15(-28.45,-4.1) 16(-28.15,4.1) 17(-27.85,-4.1) 18(-27.55,4.1) 19(-27.25,-4.1) 20(-26.95,4.1) 21(-26.65,-4.1) 22(-26.35,4.1) 23(-26.05,-4.1) 24(-25.75,4.1) 25(-25.45,-4.1) 26(-25.15,4.1) 27(-24.85,-4.1) 28(-24.55,4.1) 29(-24.25,-4.1) 30(-23.95,4.1) 31(-23.65,-4.1) 32(-23.35,4.1) 33(-23.05,-4.1) 34(-22.75,4.1) 35(-22.45,-4.1) 36(-22.15,4.1) 37(-21.85,-4.1) 38(-21.55,4.1) 39(-21.25,-4.1) 40(-20.95,4.1) 41(-17.05,-4.1) 42(-16.75,4.1) 43(-16.45,-4.1) 44(-16.15,4.1) 45(-15.85,-4.1) 46(-15.55,4.1) 47(-15.25,-4.1) 48(-14.95,4.1) 49(-14.65,-4.1) 50(-14.35,4.1) 51(-14.05,-4.1) 52(-13.75,4.1) 53(-13.45,-4.1) 54(-13.15,4.1) 55(-12.85,-4.1) 56(-12.55,4.1) 57(-12.25,-4.1) 58(-11.95,4.1) 59(-11.65,-4.1) 60(-11.35,4.1) 61(-11.05,-4.1) 62(-10.75,4.1) 63(-10.45,-4.1) 64(-10.15,4.1) 65(-9.85,-4.1) 66(-9.55,4.1) 67(-9.25,-4.1) 68(-8.95,4.1) 69(-8.65,-4.1) 70(-8.35,4.1) 71(-8.05,-4.1) 72(-7.75,4.1) 73(-7.45,-4.1) 74(-7.15,4.1) 75(-6.85,-4.1) 76(-6.55,4.1) 77(-6.25,-4.1) 78(-5.95,4.1) 79(-5.65,-4.1) 80(-5.35,4.1) 81(-5.05,-4.1) 82(-4.75,4.1) 83(-4.45,-4.1) 84(-4.15,4.1) 85(-3.85,-4.1) 86(-3.55,4.1) 87(-3.25,-4.1) 88(-2.95,4.1) 89(-2.65,-4.1) 90(-2.35,4.1) 91(-2.05,-4.1) 92(-1.75,4.1) 93(-1.45,-4.1) 94(-1.15,4.1) 95(-0.85,-4.1) 96(-0.55,4.1) 97(-0.25,-4.1) 98(0.05,4.1) 99(0.35,-4.1) 100(0.65,4.1) 101(0.95,-4.1) 102(1.25,4.1) 103(1.55,-4.1) 104(1.85,4.1) 105(2.15,-4.1) 106(2.45,4.1) 107(2.75,-4.1) 108(3.05,4.1) 109(3.35,-4.1) 110(3.65,4.1) 111(3.95,-4.1) 112(4.25,4.1) 113(4.55,-4.1) 114(4.85,4.1) 115(5.15,-4.1) 116(5.45,4.1) 117(5.75,-4.1) 118(6.05,4.1) 119(6.35,-4.1) 120(6.65,4.1) 121(6.95,-4.1) 122(7.25,4.1) 123(7.55,-4.1) 124(7.85,4.1) 125(8.15,-4.1) 126(8.45,4.1) 127(8.75,-4.1) 128(9.05,4.1) 129(9.35,-4.1) 130(9.65,4.1) 131(9.95,-4.1) 132(10.25,4.1) 133(10.55,-4.1) 134(10.85,4.1) 135(11.15,-4.1) 136(11.45,4.1) 137(11.75,-4.1) 138(12.05,4.1) 139(12.35,-4.1) 140(12.65,4.1) 141(12.95,-4.1) 142(13.25,4.1) 143(13.55,-4.1) 144(13.85,4.1) 145(14.15,-4.1) 146(14.45,4.1) 147(14.75,-4.1) 148(15.05,4.1) 149(15.35,-4.1) 150(15.65,4.1) 151(15.95,-4.1) 152(16.25,4.1) 153(16.55,-4.1) 154(16.85,4.1) 155(17.15,-4.1) 156(17.45,4.1) 157(17.75,-4.1) 158(18.05,4.1) 159(18.35,-4.1) 160(18.65,4.1) 161(18.95,-4.1) 162(19.25,4.1) 163(19.55,-4.1) 164(19.85,4.1) 165(20.15,-4.1) 166(20.45,4.1) 167(20.75,-4.1) 168(21.05,4.1) 169(21.35,-4.1) 170(21.65,4.1) 171(21.95,-4.1) 172(22.25,4.1) 173(22.55,-4.1) 174(22.85,4.1) 175(23.15,-4.1) 176(23.45,4.1) 177(23.75,-4.1) 178(24.05,4.1) 179(24.35,-4.1) 180(24.65,4.1) 181(24.95,-4.1) 182(25.25,4.1) 183(25.55,-4.1) 184(25.85,4.1) 185(26.15,-4.1) 186(26.45,4.1) 187(26.75,-4.1) 188(27.05,4.1) 189(27.35,-4.1) 190(27.65,4.1) 191(27.95,-4.1) 192(28.25,4.1) 193(28.55,-4.1) 194(28.85,4.1) 195(29.15,-4.1) 196(29.45,4.1) 197(29.75,-4.1) 198(30.05,4.1) 199(30.35,-4.1) 200(30.65,4.1)
  round 1.1 hole 1.1: 1(32.4,0)
  rect 4.5x4.6 smd: M1(-33.55,12) M2(31.55,12)
Top Overlay:
  region: 0,0 0.254,0 0.254,0.254 0,0.254
  lines w0.203: -36.65,16.35 -36.65,9.9 -35.5,8.55 -35.5,1.85 ; -35.25,8.45 cw(c52.49,6.921) -34.75,16.4 ; -33.65,-3.8 -33.65,-4.9 -36.45,-4.9 -36.45,1.75 34.45,1.75 34.45,-4.9 31.65,-4.9 31.65,-3.8 ; -18.9,1.85 -18.9,3.85 cw(c-18.55,3.825) -18.2,3.85 -18.2,1.85 ; 33.25,8.45 ccw(c-54.49,6.921) 32.75,16.4 ; 33.5,1.85 33.5,8.55 34.65,9.9 34.65,16.35 ; -34.75,16.4 -33.85,16.25 -33.25,17.85 -33.85,18.05 cw(c-33.795,18.198) -33.75,18.35 -33.15,18.15 ccw(c-38.2,18.8) -33.35,20.35 ccw(c-34.199,19.968) -35.1,20.2 -35.45,16.55 -34.75,16.4 ; 32.75,16.4 31.85,16.25 31.25,17.85 31.85,18.05 ccw(c31.795,18.198) 31.75,18.35 31.15,18.15 cw(c36.2,18.8) 31.35,20.35 cw(c32.199,19.968) 33.1,20.2 33.45,16.55 32.75,16.4
  text "DDR STD" at -33.25,-0.75 h2.76
Mechanical 11:
  lines w0.203: -19.8,1.85 -19.8,3.85 cw(c-19.45,3.825) -19.1,3.85 -19.1,1.85
Mechanical 16:
  lines w0.203: -35.4,4.4 33.4,4.4 ; -33.65,-3.8 31.65,-3.8 ; -33.55,-4.4 31.55,-4.4

## 1-1445055-1 [mm]
pads (13):
  round 3 hole 3: 1(-12.85,0) 1(12.85,0)
  round 1.676 hole 1: 1(15,4.32) 2(12,4.32) 3(9,4.32) 4(6,4.32) 5(3,4.32) 6(0,4.32) 7(-3,4.32) 8(-6,4.32) 9(-9,4.32) 10(-12,4.32) 11(-15,4.32)
Top Overlay:
  region: 0,0 0.254,0 0.254,0.254 0,0.254
  region: 0,0 0.254,0 0.254,0.254 0,0.254
  region: 0,0 0.254,0 0.254,0.254 0,0.254
  region: 0,0 0.254,0 0.254,0.254 0,0.254
  lines w0.203: -17.9,-0.7 -17.9,1.3 ; -17,-0.35 -17.525,-0.35 -17.525,-0.85 -17.75,-0.85 -18.475,-0.425 -18.475,1.025 -17.75,1.45 -17,1.45 ; -16.175,4.525 -16.9,4.525 -16.9,-4.5 16.9,-4.5 16.9,4.525 16.1,4.525 ; -13.925,4.175 -13.05,4.175 ; -10.925,4.175 -10.05,4.175 ; -7.925,4.175 -7.05,4.175 ; -4.925,4.175 -4.05,4.175 ; -1.925,4.175 -1.05,4.175 ; -1.8,-4.4 -1.8,-1.2 1.8,-1.2 1.8,-4.4 ; -1.425,-4.45 ccw(c-2.325,-3.775) -1.2,-3.775 -1.2,-2.65 ; 1.075,4.175 1.95,4.175 ; 1.425,-4.45 cw(c2.325,-3.775) 1.2,-3.775 1.2,-2.65 ; 4.075,4.175 4.95,4.175 ; 7.075,4.175 7.95,4.175 ; 10.075,4.175 10.95,4.175 ; 13.075,4.175 13.95,4.175 ; 17,-1.45 17.75,-1.45 18.475,-1.025 18.475,0.425 17.75,0.85 17.525,0.85 17.525,0.35 17,0.35 ; 17.9,-1.3 17.9,0.7 ; -1.2,-2.65 1.2,-2.65 ; -1.2,-2.65 -1.2,-1.75 1.2,-1.75 1.2,-2.65
Mechanical 16:
  rectangle: 14.688,3.513 15.325,5
  rectangle: 8.688,3.513 9.325,5
  rectangle: 11.688,3.513 12.325,5
  rectangle: 5.688,3.513 6.325,5
  rectangle: 2.688,3.513 3.325,5
  rectangle: -0.312,3.513 0.325,5
  rectangle: -3.312,3.513 -2.675,5
  rectangle: -6.312,3.513 -5.675,5
  rectangle: -9.312,3.513 -8.675,5
  rectangle: -12.312,3.513 -11.675,5
  rectangle: -15.312,3.513 -14.675,5
  lines w0.203: -16.175,4.525 -15.575,4.525 -15.575,3.4 -14.425,3.4 -14.425,4.175 -13.925,4.175 ; -13.05,4.175 -12.575,4.175 -12.575,3.4 -11.425,3.4 -11.425,4.175 -10.925,4.175 ; -10.05,4.175 -9.575,4.175 -9.575,3.4 -8.425,3.4 -8.425,4.175 -7.925,4.175 ; -7.05,4.175 -6.575,4.175 -6.575,3.4 -5.425,3.4 -5.425,4.175 -4.925,4.175 ; -4.05,4.175 -3.575,4.175 -3.575,3.4 -2.425,3.4 -2.425,4.175 -1.925,4.175 ; -1.05,4.175 -0.575,4.175 -0.575,3.4 0.575,3.4 0.575,4.175 1.075,4.175 ; 1.95,4.175 2.425,4.175 2.425,3.4 3.575,3.4 3.575,4.175 4.075,4.175 ; 4.95,4.175 5.425,4.175 5.425,3.4 6.575,3.4 6.575,4.175 7.075,4.175 ; 7.95,4.175 8.425,4.175 8.425,3.4 9.575,3.4 9.575,4.175 10.075,4.175 ; 10.95,4.175 11.425,4.175 11.425,3.4 12.575,3.4 12.575,4.175 13.075,4.175 ; 13.95,4.175 14.425,4.175 14.425,3.4 15.575,3.4 15.575,4.525 16.1,4.525

## 1-1445055-2 [mil]
pads (14):
  round 118.11 hole 118.11: 1(-564.96,0) 1(564.96,0)
  round 66 hole 39.37: 1(649.61,170.08) 2(531.5,170.08) 3(413.39,170.08) 4(295.28,170.08) 5(177.17,170.08) 6(59.06,170.08) 7(-59.06,170.08) 8(-177.17,170.08) 9(-295.28,170.08) 10(-413.39,170.08) 11(-531.5,170.08) 12(-649.61,170.08)
Top Overlay:
  region: 0,0 10,0 10,10 0,10
  region: 0,0 10,0 10,10 0,10
  region: 0,0 10,0 10,10 0,10
  region: 0,0 10,0 10,10 0,10
  lines w8: -763.78,-27.56 -763.78,51.18 ; -728.35,-13.78 -749.02,-13.78 -749.02,-33.46 -757.87,-33.46 -786.42,-16.73 -786.42,40.35 -757.87,57.09 -728.35,57.09 ; -695.87,178.15 -724.41,178.15 -724.41,-177.17 724.41,-177.17 724.41,178.15 692.91,178.15 ; -607.28,164.37 -572.83,164.37 ; -489.17,164.37 -454.72,164.37 ; -371.06,164.37 -336.61,164.37 ; -252.95,164.37 -218.5,164.37 ; -134.84,164.37 -100.39,164.37 ; -70.87,-173.23 -70.87,-47.24 70.87,-47.24 70.87,-173.23 ; -56.1,-175.2 ccw(c-91.54,-148.62) -47.24,-148.62 -47.24,-104.33 ; -16.73,164.37 17.72,164.37 ; 56.1,-175.2 cw(c91.54,-148.62) 47.24,-148.62 47.24,-104.33 ; 101.38,164.37 135.83,164.37 ; 219.49,164.37 253.94,164.37 ; 337.6,164.37 372.05,164.37 ; 455.71,164.37 490.16,164.37 ; 573.82,164.37 608.27,164.37 ; 728.35,-57.09 757.87,-57.09 786.42,-40.35 786.42,16.73 757.87,33.46 749.02,33.46 749.02,13.78 728.35,13.78 ; 763.78,-51.18 763.78,27.56 ; -47.24,-104.33 47.24,-104.33 ; -47.24,-104.33 -47.24,-68.9 47.24,-68.9 47.24,-104.33
Mechanical 16:
  rectangle: 637.3,138.29 662.4,196.85
  rectangle: 401.08,138.29 426.18,196.85
  rectangle: 519.19,138.29 544.29,196.85
  rectangle: 282.97,138.29 308.07,196.85
  rectangle: 164.86,138.29 189.96,196.85
  rectangle: 46.75,138.29 71.85,196.85
  rectangle: -71.36,138.29 -46.26,196.85
  rectangle: -189.47,138.29 -164.37,196.85
  rectangle: -307.58,138.29 -282.48,196.85
  rectangle: -425.69,138.29 -400.59,196.85
  rectangle: -543.8,138.29 -518.7,196.85
  rectangle: -661.91,138.29 -636.82,196.85
  lines w8: -695.87,178.15 -672.24,178.15 -672.24,133.86 -626.97,133.86 -626.97,164.37 -607.28,164.37 ; -572.83,164.37 -554.13,164.37 -554.13,133.86 -508.86,133.86 -508.86,164.37 -489.17,164.37 ; -454.72,164.37 -436.02,164.37 -436.02,133.86 -390.75,133.86 -390.75,164.37 -371.06,164.37 ; -336.61,164.37 -317.91,164.37 -317.91,133.86 -272.64,133.86 -272.64,164.37 -252.95,164.37 ; -218.5,164.37 -199.8,164.37 -199.8,133.86 -154.53,133.86 -154.53,164.37 -134.84,164.37 ; -100.39,164.37 -81.69,164.37 -81.69,133.86 -36.42,133.86 -36.42,164.37 -16.73,164.37 ; 17.72,164.37 36.42,164.37 36.42,133.86 81.69,133.86 81.69,164.37 101.38,164.37 ; 135.83,164.37 154.53,164.37 154.53,133.86 199.8,133.86 199.8,164.37 219.49,164.37 ; 253.94,164.37 272.64,164.37 272.64,133.86 317.91,133.86 317.91,164.37 337.6,164.37 ; 372.05,164.37 390.75,164.37 390.75,133.86 436.02,133.86 436.02,164.37 455.71,164.37 ; 490.16,164.37 508.86,164.37 508.86,133.86 554.13,133.86 554.13,164.37 573.82,164.37 ; 608.27,164.37 626.97,164.37 626.97,133.86 672.24,133.86 672.24,178.15 692.91,178.15